# Altium footprint library 3.22-杂项.PcbLib: 985 footprints (part 11 of 64)
Each footprint in its own frame and in the unit in brackets; x right, y up, seen from the top. Pads: shape width x height; smd on the part's side, far side on the other; paste and mask are expansions set on the pad; w line width, h text height; cw(c..) or ccw(c..) is an arc to the next point about the centre after c.
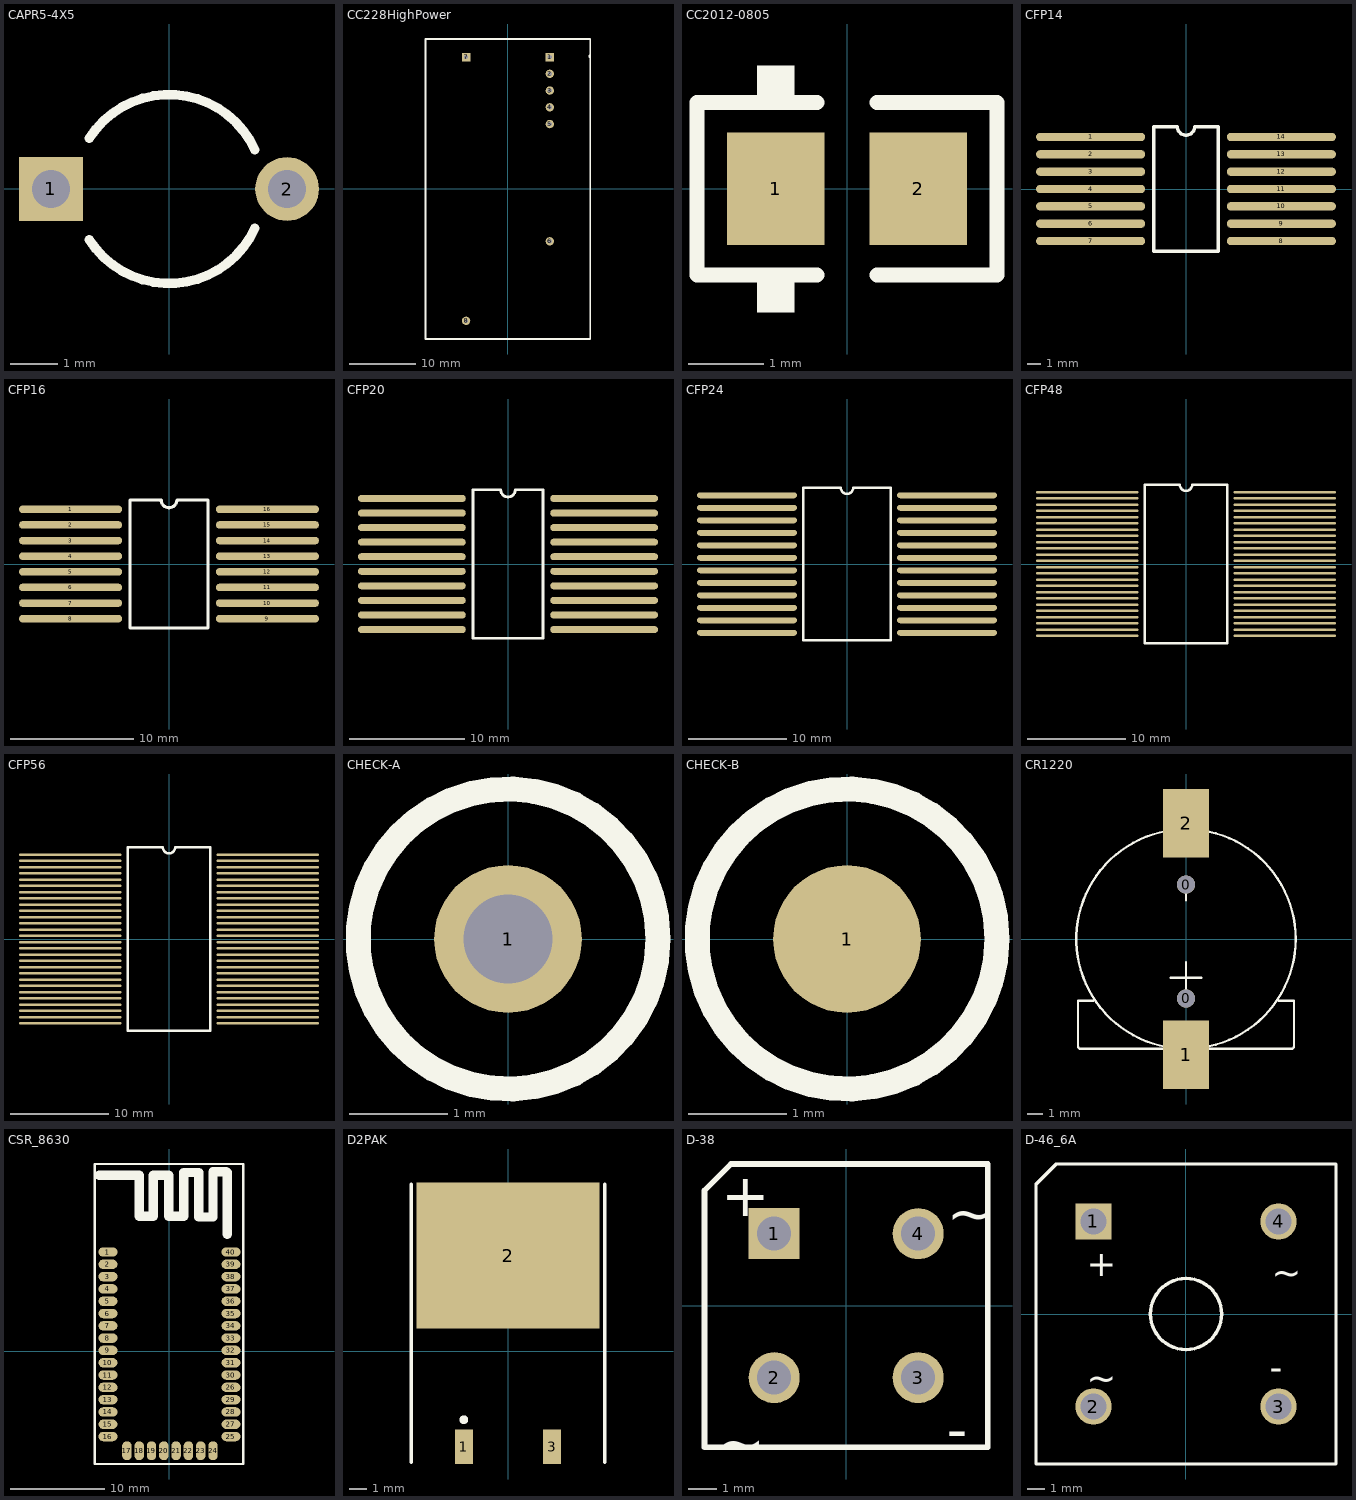
[diagram p10: the footprints below, top view; thin cyan lines are the x and y axes]

## CAPR5-4X5 [mm] "Capacitor; 2 Leads"
height 12
pads (2):
  rect 1.35x1.35 hole 0.8: 1(-2.5,0)
  round 1.35 hole 0.8: 2(2.5,0)
Top Overlay:
  lines w0.2: -1.687,-1.075 ccw(c0,0) 1.819,-0.832 ; -1.687,1.075 cw(c0,0) 1.819,0.832

## CC228HighPower [mil] "CC228HighPower"
height 472
pads (8):
  rect 50x50 hole 25: 1(250,787.5) 7(-250,787.5)
  round 50 hole 25: 2(250,687.5) 3(250,587.5) 4(250,487.5) 5(250,387.5) 6(250,-312.5) 8(-250,-787.5)
Top Overlay:
  circle w1: c487.92,792.5 r5.08
  lines w10: -492.25,-895.84 492,-895.84 492,895.5 -492.25,895.5 -492.25,-895.84

## CC2012-0805 [mm]
pads (2):
  rect 1.3x1.5 smd: 1(-0.95,0) 2(0.95,0)
Top Overlay:
  rectangle: -1.201,1.24 -0.701,1.64
  rectangle: -1.2,-1.649 -0.7,-1.249
  lines w0.2: -0.4,-1.15 -2,-1.15 -2,1.15 -0.4,1.15 ; 0.4,-1.15 2,-1.15 2,1.15 0.4,1.15

## CFP14 [mil]
pads (14):
  oval 315x24 smd: 1(-275,150) 2(-275,100) 3(-275,50) 4(-275,0) 5(-275,-50) 6(-275,-100) 7(-275,-150) 8(275,-150) 9(275,-100) 10(275,-50) 11(275,0) 12(275,50) 13(275,100) 14(275,150)
Top Overlay:
  lines w10: -93,-180 -93,180 -25,180 ccw(c0,180) 25,180 93,180 93,-180 -93,-180

## CFP16 [mil]
pads (16):
  oval 330x24 smd: 1(-315,175) 2(-315,125) 3(-315,75) 4(-315,25) 5(-315,-25) 6(-315,-75) 7(-315,-125) 8(-315,-175) 9(315,-175) 10(315,-125) 11(315,-75) 12(315,-25) 13(315,25) 14(315,75) 15(315,125) 16(315,175)
Top Overlay:
  lines w10: -125,-205 -125,205 -25,205 ccw(c0,205) 25,205 125,205 125,-205 -125,-205

## CFP20 [mil]
pads (20):
  oval 370x24 smd: 1(-330,225) 2(-330,175) 3(-330,125) 4(-330,75) 5(-330,25) 6(-330,-25) 7(-330,-75) 8(-330,-125) 9(-330,-175) 10(-330,-225) 11(330,-225) 12(330,-175) 13(330,-125) 14(330,-75) 15(330,-25) 16(330,25) 17(330,75) 18(330,125) 19(330,175) 20(330,225)
Top Overlay:
  lines w10: -120,-255 120,-255 120,255 25,255 cw(c0,255) -25,255 -120,255 -120,-255

## CFP24 [mil]
pads (24):
  oval 400x24 smd: 1(-400,275) 2(-400,225) 3(-400,175) 4(-400,125) 5(-400,75) 6(-400,25) 7(-400,-25) 8(-400,-75) 9(-400,-125) 10(-400,-175) 11(-400,-225) 12(-400,-275) 13(400,-275) 14(400,-225) 15(400,-175) 16(400,-125) 17(400,-75) 18(400,-25) 19(400,25) 20(400,75) 21(400,125) 22(400,175) 23(400,225) 24(400,275)
Top Overlay:
  lines w10: -175,-305 175,-305 175,305 25,305 cw(c0,305) -25,305 -175,305 -175,-305

## CFP48 [mil]
pads (48):
  oval 410x10 smd: 1(-395,287.5) 2(-395,262.5) 3(-395,237.5) 4(-395,212.5) 5(-395,187.5) 6(-395,162.5) 7(-395,137.5) 8(-395,112.5) 9(-395,87.5) 10(-395,62.5) 11(-395,37.5) 12(-395,12.5) 13(-395,-12.5) 14(-395,-37.5) 15(-395,-62.5) 16(-395,-87.5) 17(-395,-112.5) 18(-395,-137.5) 19(-395,-162.5) 20(-395,-187.5) 21(-395,-212.5) 22(-395,-237.5) 23(-395,-262.5) 24(-395,-287.5) 25(395,-287.5) 26(395,-262.5) 27(395,-237.5) 28(395,-212.5) 29(395,-187.5) 30(395,-162.5) 31(395,-137.5) 32(395,-112.5) 33(395,-87.5) 34(395,-62.5) 35(395,-37.5) 36(395,-12.5) 37(395,12.5) 38(395,37.5) 39(395,62.5) 40(395,87.5) 41(395,112.5) 42(395,137.5) 43(395,162.5) 44(395,187.5) 45(395,212.5) 46(395,237.5) 47(395,262.5) 48(395,287.5)
Top Overlay:
  lines w10: -165,-317.5 165,-317.5 165,317.5 25,317.5 cw(c0,317.5) -25,317.5 -165,317.5 -165,-317.5

## CFP56 [mil]
pads (56):
  oval 410x10 smd: 1(-395,337.5) 2(-395,312.5) 3(-395,287.5) 4(-395,262.5) 5(-395,237.5) 6(-395,212.5) 7(-395,187.5) 8(-395,162.5) 9(-395,137.5) 10(-395,112.5) 11(-395,87.5) 12(-395,62.5) 13(-395,37.5) 14(-395,12.5) 15(-395,-12.5) 16(-395,-37.5) 17(-395,-62.5) 18(-395,-87.5) 19(-395,-112.5) 20(-395,-137.5) 21(-395,-162.5) 22(-395,-187.5) 23(-395,-212.5) 24(-395,-237.5) 25(-395,-262.5) 26(-395,-287.5) 27(-395,-312.5) 28(-395,-337.5) 29(395,-337.5) 30(395,-312.5) 31(395,-287.5) 32(395,-262.5) 33(395,-237.5) 34(395,-212.5) 35(395,-187.5) 36(395,-162.5) 37(395,-137.5) 38(395,-112.5) 39(395,-87.5) 40(395,-62.5) 41(395,-37.5) 42(395,-12.5) 43(395,12.5) 44(395,37.5) 45(395,62.5) 46(395,87.5) 47(395,112.5) 48(395,137.5) 49(395,162.5) 50(395,187.5) 51(395,212.5) 52(395,237.5) 53(395,262.5) 54(395,287.5) 55(395,312.5) 56(395,337.5)
Top Overlay:
  lines w10: -165,-367.5 165,-367.5 165,367.5 25,367.5 cw(c0,367.5) -25,367.5 -165,367.5 -165,-367.5

## CHECK-A [mm] "Connector; Plug"
height 1.45
pads (1):
  round 1.5 hole 0.9: 1(0,0)
Top Overlay:
  circle w0.254: c0,0 r1.524

## CHECK-B [mm] "Connector; Plug"
height 1.45
pads (1):
  round 1.5 smd: 1(0,0)
Top Overlay:
  circle w0.254: c0,0 r1.524

## CR1220 [mm]
pads (4):
  round 1.2 hole 1.2: 0(0,-3.912) 0(0,3.581)
  rect 3x4.5 smd: 1(0,-7.62) 2(0,7.62)
Top Overlay:
  circle w0.152: c0,0 r7.22
  lines w0.152: -6.096,-4.064 -7.112,-4.064 -7.112,-7.112 -7.004,-7.22 0,-7.22 7.004,-7.22 7.112,-7.112 7.112,-4.064 6.096,-4.064 ; -1.016,-2.54 1.016,-2.54 ; 0,-3.556 0,-1.524 ; 0,2.54 0,4.064

## CSR_8630 [mm]
pads (40):
  oval 2x1 smd: 1(-6.5,10.5) 2(-6.5,9.2) 3(-6.5,7.9) 4(-6.5,6.6) 5(-6.5,5.3) 6(-6.5,4) 7(-6.5,2.7) 8(-6.5,1.4) 9(-6.5,0.1) 10(-6.5,-1.2) 11(-6.5,-2.5) 12(-6.5,-3.8) 13(-6.5,-5.1) 14(-6.5,-6.4) 15(-6.5,-7.7) 16(-6.5,-9) 25(6.5,-9) 26(6.5,-3.8) 27(6.5,-7.7) 28(6.5,-6.4) 29(6.5,-5.1) 30(6.5,-2.5) 31(6.5,-1.2) 32(6.5,0.1) 33(6.5,1.4) 34(6.5,2.7) 35(6.5,4) 36(6.5,5.3) 37(6.5,6.6) 38(6.5,7.9) 39(6.5,9.2) 40(6.5,10.5)
  oval 1x2 smd: 17(-4.5,-10.5) 18(-3.2,-10.5) 19(-1.9,-10.5) 20(-0.6,-10.5) 21(0.7,-10.5) 22(2,-10.5) 23(3.3,-10.5) 24(4.6,-10.5)
Top Overlay:
  lines w0.254: -7.9,-11.9 7.8,-11.9 7.8,19.8 -7.9,19.8 -7.9,-11.9
  lines w1: -7.4,18.6 -3.2,18.6 -3.2,14.3 -1.7,14.3 -1.7,18.6 -0.1,18.6 -0.1,14.3 1.5,14.3 1.5,18.9 3.1,18.9 3.1,14.2 4.6,14.2 4.6,19 6,19 6.1,18.9 6.1,12.4

## D2PAK [mm] "D2-PAK/TO-263-AB; 3 Leads (1 Cropped); Body 15.5 (inc. leads) x 10.5 mm (LxW max)"
height 4.69
pads (3):
  rect 1.05x2 smd: 1(-2.54,-5.5) 3(2.54,-5.5)
  rect 10.55x8.4 smd: 2(0,5.5)
Top Overlay:
  circle w0.25: c-2.54,-3.95 r0.125
  lines w0.2: -5.575,-6.4 -5.575,9.6 ; 5.575,-6.4 5.575,9.6

## D-38 [mm] "Bridge Rectifier; 4 Terminals; Body 9.4 x 9.4 mm (typ); Pitch 5.08 mm"
height 9.91
pads (4):
  rect 1.8x1.8 hole 1.2: 1(-2.54,2.54)
  round 1.8 hole 1.2: 2(-2.54,-2.54) 3(2.54,-2.54) 4(2.54,2.54)
Top Overlay:
  lines w0.2: -5,-5 5,-5 5,5 -4.064,5 -5,4.064 -5,-5
  text "~" at 3.556,2.54 h1.5
  text "~" at -4.572,-5.588 h1.5
  text "-" at 3.556,-5.08 h1.5
  text "+" at -4.41,3.164 h1.5

## D-46_6A [mm] "Bridge Rectifier; 4 Terminals; Body 16.8 x 16.8 mm (typ); Pitch 10.67 mm"
height 6.35
pads (4):
  rect 2.1x2.1 hole 1.5: 1(-5.335,5.335)
  round 2.1 hole 1.5: 2(-5.335,-5.335) 3(5.335,-5.335) 4(5.335,5.335)
Top Overlay:
  circle w0.2: c0,0 r2.05
  lines w0.2: -8.65,-8.65 8.65,-8.65 8.65,8.65 -7.474,8.65 -8.65,7.474 -8.65,-8.65
  text "~" at -5.723,-4.437 h1.5
  text "~" at 4.945,1.659 h1.5
  text "-" at 4.825,-3.809 h1.5
  text "+" at -5.723,2.167 h1.5